# Altium footprint library Generic Footprint.PcbLib: 160 footprints (part 14 of 20) (continued)
## Symbol_FCC-Logo-1.5x1mm_silkscreen [mm] (continued)
1(0.03,0.585) 1(0.03,0.586) 1(0.03,0.588) 1(0.03,0.59) 1(0.03,0.592) 1(0.03,0.593) 1(0.03,0.595) 1(0.03,0.597) 1(0.03,0.598) 1(0.03,0.6) 1(0.03,0.602) 1(0.03,0.603) 1(0.03,0.605) 1(0.03,0.607) 1(0.03,0.609) 1(0.03,0.61) 1(0.03,0.612) 1(0.03,0.614) 1(0.03,0.615) 1(0.03,0.617) 1(0.03,0.619) 1(0.03,0.62) 1(0.03,0.622) 1(0.03,0.624) 1(0.03,0.626) 1(0.03,0.627) 1(0.03,0.629) 1(0.03,0.631) 1(0.03,0.632) 1(0.03,0.634) 1(0.03,0.636) 1(0.03,0.637) 1(0.03,0.639) 1(0.03,0.641) 1(0.03,0.643) 1(0.03,0.644) 1(0.03,0.646) 1(0.03,0.648) 1(0.03,0.649) 1(0.03,0.651) 1(0.03,0.653) 1(0.03,0.654) 1(0.03,0.656) 1(0.03,0.658) 1(0.03,0.659) 1(0.03,0.661) 1(0.03,0.663) 1(0.03,0.665) 1(0.03,0.666) 1(0.03,0.668) 1(0.03,0.67) 1(0.03,0.671) 1(0.03,0.673) 1(0.03,0.675) 1(0.03,0.677) 1(0.03,0.678) 1(0.03,0.68) 1(0.03,0.682) 1(0.03,0.683) 1(0.03,0.685) 1(0.03,0.687) 1(0.03,0.688) 1(0.03,0.69) 1(0.03,0.692) 1(0.03,0.694) 1(0.03,0.695) 1(0.03,0.697) 1(0.03,0.699) 1(0.03,0.7) 1(0.03,0.702) 1(0.03,0.704) 1(0.03,0.705) 1(0.03,0.707) 1(0.03,0.709) 1(0.03,0.711) 1(0.03,0.712) 1(0.03,0.714) 1(0.03,0.716) 1(0.03,0.717) 1(0.03,0.719) 1(0.03,0.721) 1(0.03,0.722) 1(0.03,0.724) 1(0.03,0.726) 1(0.03,0.728) 1(0.03,0.729) 1(0.03,0.731) 1(0.03,0.733) 1(0.03,0.734) 1(0.03,0.736) 1(0.03,0.738) 1(0.03,0.739) 1(0.03,0.741) 1(0.03,0.743) 1(0.03,0.744) 1(0.03,0.746) 1(0.03,0.748) 1(0.03,0.75) 1(0.03,0.751) 1(0.03,0.753) 1(0.03,0.755) 1(0.03,0.756) 1(0.03,0.758) 1(0.03,0.76) 1(0.03,0.762) 1(0.03,0.763) 1(0.03,0.765) 1(0.03,0.767) 1(0.03,0.768) 1(0.03,0.77) 1(0.03,0.772) 1(0.03,0.773) 1(0.03,0.775) 1(0.03,0.777) 1(0.03,0.779) 1(0.03,0.78) 1(0.03,0.782) 1(0.03,0.784) 1(0.03,0.785) 1(0.03,0.787) 1(0.03,0.789) 1(0.03,0.79) 1(0.03,0.792) 1(0.03,0.794) 1(0.03,0.796) 1(0.03,0.797) 1(0.03,0.799) 1(0.03,0.801) 1(0.03,0.802) 1(0.03,0.804) 1(0.03,0.806) 1(0.03,0.807) 1(0.03,0.809) 1(0.03,0.811) 1(0.03,0.813) 1(0.03,0.814) 1(0.03,0.816) 1(0.03,0.818) 1(0.03,0.819) 1(0.03,0.821) 1(0.03,0.823) 1(0.03,0.824) 1(0.03,0.826) 1(0.03,0.828) 1(0.03,0.83) 1(0.03,0.831) 1(0.03,0.833) 1(0.03,0.835) 1(0.03,0.836) 1(0.03,0.838) 1(0.03,0.84) 1(0.03,0.841) 1(0.03,0.843) 1(0.03,0.845) 1(0.03,0.847) 1(0.03,0.848) 1(0.03,0.85) 1(0.03,0.852) 1(0.03,0.853) 1(0.03,0.855) 1(0.03,0.857) 1(0.03,0.858) 1(0.03,0.86) 1(0.03,0.862) 1(0.03,0.863) 1(0.03,0.865) 1(0.03,0.867) 1(0.03,0.869) 1(0.03,0.87) 1(0.03,0.872) 1(0.03,0.874) 1(0.03,0.875) 1(0.03,0.877) 1(0.03,0.879) 1(0.03,0.881) 1(0.03,0.882) 1(0.03,0.884) 1(0.03,0.886) 1(0.03,0.887) 1(0.03,0.889) 1(0.03,0.891) 1(0.03,0.892) 1(0.03,0.894) 1(0.03,0.896) 1(0.03,0.898) 1(0.03,0.899) 1(0.03,0.901) 1(0.03,0.903) 1(0.03,0.904) 1(0.03,0.906) 1(0.03,0.908) 1(0.03,0.909) 1(0.03,0.911) 1(0.03,0.913) 1(0.03,0.915) 1(0.03,0.916) 1(0.03,0.918) 1(0.03,0.92) 1(0.03,0.921) 1(0.03,0.923) 1(0.03,0.925) 1(0.03,0.926) 1(0.03,0.928) 1(0.03,0.932) 1(0.03,0.933) 1(0.03,0.935) 1(0.03,0.937) 1(0.03,0.938) 1(0.03,0.94) 1(0.03,0.942) 1(0.03,0.943) 1(0.032,0.036) 1(0.032,0.037) 1(0.032,0.039) 1(0.032,0.042) 1(0.032,0.933) 1(0.032,0.935) 1(0.032,0.937) 1(0.032,0.938) 1(0.032,0.94) 1(0.032,0.942) 1(0.032,0.943) 1(0.032,0.947) 1(0.032,0.948) 1(0.032,0.95) 1(0.034,0.037) 1(0.034,0.039) 1(0.034,0.041) 1(0.034,0.94) 1(0.034,0.942) 1(0.034,0.943) 1(0.034,0.945) 1(0.034,0.947) 1(0.034,0.948) 1(0.034,0.95) 1(0.034,0.954) 1(0.034,0.959) 1(0.036,0.034) 1(0.036,0.036) 1(0.036,0.947) 1(0.036,0.948) 1(0.036,0.95) 1(0.036,0.952) 1(0.036,0.954) 1(0.036,0.957) 1(0.037,0.032) 1(0.037,0.034) 1(0.037,0.036) 1(0.037,0.959) 1(0.037,0.962) 1(0.037,0.964) 1(0.037,0.966) 1(0.039,0.954) 1(0.039,0.955) 1(0.039,0.967) 1(0.041,0.031) 1(0.041,0.959) 1(0.041,0.96) 1(0.041,0.969) 1(0.041,0.971) 1(0.041,0.972) 1(0.041,0.974) 1(0.042,0.032) 1(0.042,0.034) 1(0.042,0.971) 1(0.042,0.972) 1(0.042,0.974) 1(0.042,0.977) 1(0.044,0.029) 1(0.044,0.971) 1(0.044,0.972) 1(0.044,0.974) 1(0.044,0.977) 1(0.046,0.031) 1(0.046,0.032) 1(0.047,0.976) 1(0.047,0.977) 1(0.047,0.984) 1(0.049,0.027) 1(0.049,0.979) 1(0.049,0.981) 1(0.049,0.983) 1(0.049,0.984) 1(0.049,0.988) 1(0.049,0.989) 1(0.049,0.991) 1(0.049,0.993) 1(0.051,0.025) 1(0.051,0.029) 1(0.051,0.031) 1(0.051,0.984) 1(0.051,0.986) 1(0.051,0.988) 1(0.051,0.989) 1(0.051,0.994) 1(0.053,0.988) 1(0.053,0.989) 1(0.053,0.993) 1(0.053,0.994) 1(0.053,0.996) 1(0.054,0.993) 1(0.054,0.994) 1(0.054,0.998) 1(0.056,1) 1(0.056,1.001) 1(0.058,1.001) 1(0.058,1.003) 1(0.059,1.001) 1(0.059,1.003) 1(0.059,1.006) 1(0.059,1.008) 1(0.061,1.003) 1(0.061,1.006) 1(0.061,1.008) 1(0.061,1.011) 1(0.063,1.005) 1(0.063,1.01) 1(0.063,1.013) 1(0.065,1.006) 1(0.065,1.008) 1(0.065,1.01) 1(0.065,1.011) 1(0.066,1.01) 1(0.066,1.011) 1(0.066,1.015) 1(0.066,1.017) 1(0.066,1.018) 1(0.068,1.02) 1(0.07,1.022) 1(0.073,1.025) 1(0.073,1.027) 1(0.075,1.025) 1(0.075,1.027) 1(0.075,1.028) 1(0.076,1.023) 1(0.076,1.025) 1(0.076,1.028) 1(0.076,1.03) 1(0.078,1.027) 1(0.078,1.03) 1(0.078,1.032) 1(0.08,1.028) 1(0.08,1.03) 1(0.08,1.034) 1(0.081,1.032) 1(0.081,1.035) 1(0.083,1.032) 1(0.083,1.037) 1(0.085,1.039) 1(0.087,1.037) 1(0.087,1.04) 1(0.088,1.037) 1(0.088,1.039) 1(0.088,1.042) 1(0.09,1.039) 1(0.09,1.04) 1(0.09,1.044) 1(0.092,1.04) 1(0.092,1.042) 1(0.092,1.044) 1(0.092,1.045) 1(0.093,1.042) 1(0.093,1.045) 1(0.093,1.047) 1(0.095,1.044) 1(0.095,1.049) 1(0.097,1.045) 1(0.099,1.051) 1(0.1,1.052) 1(0.102,1.054) 1(0.104,1.052) 1(0.105,1.056) 1(0.107,1.052) 1(0.107,1.057) 1(0.109,1.059) 1(0.11,1.057) 1(0.11,1.059) 1(0.11,1.061) 1(0.114,1.057) 1(0.114,1.061) 1(0.114,1.062) 1(0.115,1.059) 1(0.119,1.061) 1(0.119,1.064) 1(0.121,1.066) 1(0.122,1.067) 1(0.127,1.066) 1(0.127,1.067) 1(0.127,1.069) 1(0.131,1.066) 1(0.131,1.067) 1(0.132,1.069) 1(0.132,1.071) 1(0.136,1.069) 1(0.136,1.071) 1(0.136,1.073) 1(0.143,1.071) 1(0.143,1.073) 1(0.143,1.074) 1(0.148,1.076) 1(0.15,1.073) 1(0.15,1.078) 1(0.151,1.074) 1(0.16,1.074) 1(0.161,1.079) 1(0.195,0.027) 1(0.195,0.034) 1(0.195,0.036) 1(0.195,0.037) 1(0.195,0.039) 1(0.195,0.041) 1(0.195,0.042) 1(0.195,0.044) 1(0.195,0.046) 1(0.195,0.047) 1(0.195,0.049) 1(0.195,0.051) 1(0.195,0.053) 1(0.195,0.054) 1(0.195,0.056) 1(0.195,0.058) 1(0.195,0.059) 1(0.195,0.061) 1(0.195,0.063) 1(0.195,0.065) 1(0.195,0.066) 1(0.195,0.068) 1(0.195,0.07) 1(0.195,0.071) 1(0.195,0.073) 1(0.195,0.075) 1(0.195,0.076) 1(0.195,0.078) 1(0.195,0.08) 1(0.195,0.082) 1(0.195,0.083) 1(0.195,0.085) 1(0.195,0.087) 1(0.195,0.088) 1(0.195,0.09) 1(0.195,0.092) 1(0.195,0.093) 1(0.195,0.095) 1(0.195,0.097) 1(0.195,0.099) 1(0.195,0.1) 1(0.195,0.102) 1(0.195,0.104) 1(0.195,0.105) 1(0.195,0.107) 1(0.195,0.109) 1(0.195,0.11) 1(0.195,0.112) 1(0.195,0.114) 1(0.195,0.116) 1(0.195,0.117) 1(0.195,0.119) 1(0.195,0.121) 1(0.195,0.122) 1(0.195,0.124) 1(0.195,0.126) 1(0.195,0.127) 1(0.195,0.129) 1(0.195,0.131) 1(0.195,0.132) 1(0.195,0.134) 1(0.195,0.136) 1(0.195,0.138) 1(0.195,0.139) 1(0.195,0.141) 1(0.195,0.143) 1(0.195,0.144) 1(0.195,0.146) 1(0.195,0.148) 1(0.195,0.15) 1(0.195,0.151) 1(0.195,0.153) 1(0.195,0.155) 1(0.195,0.156) 1(0.195,0.158) 1(0.195,0.16) 1(0.195,0.161) 1(0.195,0.163) 1(0.195,0.165) 1(0.195,0.166) 1(0.195,0.168) 1(0.195,0.17) 1(0.195,0.172) 1(0.195,0.173) 1(0.195,0.175) 1(0.195,0.177) 1(0.195,0.178) 1(0.195,0.18) 1(0.195,0.182) 1(0.195,0.184) 1(0.195,0.185) 1(0.195,0.187) 1(0.195,0.189) 1(0.195,0.19) 1(0.195,0.192) 1(0.195,0.194) 1(0.195,0.195) 1(0.195,0.197) 1(0.195,0.199) 1(0.195,0.201) 1(0.195,0.202) 1(0.195,0.204) 1(0.195,0.206) 1(0.195,0.207) 1(0.195,0.209) 1(0.195,0.211) 1(0.195,0.212) 1(0.195,0.214) 1(0.195,0.216) 1(0.195,0.218) 1(0.195,0.219) 1(0.195,0.221) 1(0.195,0.223) 1(0.195,0.224) 1(0.195,0.226) 1(0.195,0.228) 1(0.195,0.229) 1(0.195,0.231) 1(0.195,0.233) 1(0.195,0.235) 1(0.195,0.236) 1(0.195,0.238) 1(0.195,0.24) 1(0.195,0.241) 1(0.195,0.243) 1(0.195,0.245) 1(0.195,0.246) 1(0.195,0.248) 1(0.195,0.25) 1(0.195,0.251) 1(0.195,0.253) 1(0.195,0.255) 1(0.195,0.257) 1(0.195,0.258) 1(0.195,0.26) 1(0.195,0.262) 1(0.195,0.263) 1(0.195,0.265) 1(0.195,0.267) 1(0.195,0.269) 1(0.195,0.27) 1(0.195,0.272) 1(0.195,0.274) 1(0.195,0.275) 1(0.195,0.277) 1(0.195,0.279) 1(0.195,0.28) 1(0.195,0.282) 1(0.195,0.284) 1(0.195,0.286) 1(0.195,0.287) 1(0.195,0.289) 1(0.195,0.291) 1(0.195,0.292) 1(0.195,0.294) 1(0.195,0.296) 1(0.195,0.297) 1(0.195,0.299) 1(0.195,0.301) 1(0.195,0.303) 1(0.195,0.304) 1(0.195,0.306) 1(0.195,0.308) 1(0.195,0.309) 1(0.195,0.311) 1(0.195,0.313) 1(0.195,0.314) 1(0.195,0.316) 1(0.195,0.318) 1(0.195,0.32) 1(0.195,0.321) 1(0.195,0.323) 1(0.195,0.325) 1(0.195,0.326) 1(0.195,0.328) 1(0.195,0.33) 1(0.195,0.331) 1(0.195,0.333) 1(0.195,0.335) 1(0.195,0.336) 1(0.195,0.338) 1(0.195,0.34) 1(0.195,0.342) 1(0.195,0.343) 1(0.195,0.345) 1(0.195,0.347) 1(0.195,0.348) 1(0.195,0.35) 1(0.195,0.352) 1(0.195,0.354) 1(0.195,0.355) 1(0.195,0.357) 1(0.195,0.359) 1(0.195,0.36) 1(0.195,0.362) 1(0.195,0.364) 1(0.195,0.365) 1(0.195,0.367) 1(0.195,0.369) 1(0.195,0.371) 1(0.195,0.372) 1(0.195,0.374) 1(0.195,0.376) 1(0.195,0.377) 1(0.195,0.379) 1(0.195,0.381) 1(0.195,0.382) 1(0.195,0.384) 1(0.195,0.386) 1(0.195,0.388) 1(0.195,0.389) 1(0.195,0.391) 1(0.195,0.393) 1(0.195,0.394) 1(0.195,0.396) 1(0.195,0.398) 1(0.195,0.399) 1(0.195,0.401) 1(0.195,0.403) 1(0.195,0.405) 1(0.195,0.406) 1(0.195,0.408) 1(0.195,0.41) 1(0.195,0.411) 1(0.195,0.413) 1(0.195,0.415) 1(0.195,0.416) 1(0.195,0.418) 1(0.195,0.42) 1(0.195,0.422) 1(0.195,0.423) 1(0.195,0.425) 1(0.195,0.427) 1(0.195,0.428) 1(0.195,0.43) 1(0.195,0.432) 1(0.195,0.433) 1(0.195,0.435) 1(0.195,0.437) 1(0.195,0.439) 1(0.195,0.44) 1(0.195,0.442) 1(0.195,0.444) 1(0.195,0.445) 1(0.195,0.447) 1(0.195,0.449) 1(0.195,0.45) 1(0.195,0.452) 1(0.195,0.454) 1(0.195,0.455) 1(0.195,0.457) 1(0.195,0.459) 1(0.195,0.461) 1(0.195,0.464) 1(0.195,0.874) 1(0.195,0.875) 1(0.197,0.025) 1(0.197,0.034) 1(0.197,0.036) 1(0.197,0.037) 1(0.197,0.039) 1(0.197,0.041) 1(0.197,0.042) 1(0.197,0.044) 1(0.197,0.046) 1(0.197,0.047) 1(0.197,0.049) 1(0.197,0.051) 1(0.197,0.053) 1(0.197,0.054) 1(0.197,0.056) 1(0.197,0.058) 1(0.197,0.059) 1(0.197,0.061) 1(0.197,0.063) 1(0.197,0.065) 1(0.197,0.066) 1(0.197,0.068) 1(0.197,0.07) 1(0.197,0.071) 1(0.197,0.073) 1(0.197,0.075) 1(0.197,0.076) 1(0.197,0.078) 1(0.197,0.08) 1(0.197,0.082) 1(0.197,0.083) 1(0.197,0.085) 1(0.197,0.087) 1(0.197,0.088) 1(0.197,0.09) 1(0.197,0.092) 1(0.197,0.093) 1(0.197,0.095) 1(0.197,0.097) 1(0.197,0.099) 1(0.197,0.1) 1(0.197,0.102) 1(0.197,0.104) 1(0.197,0.105) 1(0.197,0.107) 1(0.197,0.109) 1(0.197,0.11) 1(0.197,0.112) 1(0.197,0.114) 1(0.197,0.116) 1(0.197,0.117) 1(0.197,0.119) 1(0.197,0.121) 1(0.197,0.122) 1(0.197,0.124) 1(0.197,0.126) 1(0.197,0.127) 1(0.197,0.129) 1(0.197,0.131) 1(0.197,0.132) 1(0.197,0.134) 1(0.197,0.136) 1(0.197,0.138) 1(0.197,0.139) 1(0.197,0.141) 1(0.197,0.143) 1(0.197,0.144) 1(0.197,0.146) 1(0.197,0.148) 1(0.197,0.15) 1(0.197,0.151) 1(0.197,0.153) 1(0.197,0.155) 1(0.197,0.156) 1(0.197,0.158) 1(0.197,0.16) 1(0.197,0.161) 1(0.197,0.163) 1(0.197,0.165) 1(0.197,0.166) 1(0.197,0.168) 1(0.197,0.17) 1(0.197,0.172) 1(0.197,0.173) 1(0.197,0.175) 1(0.197,0.177) 1(0.197,0.178) 1(0.197,0.18) 1(0.197,0.182) 1(0.197,0.184) 1(0.197,0.185) 1(0.197,0.187) 1(0.197,0.189) 1(0.197,0.19) 1(0.197,0.192) 1(0.197,0.194) 1(0.197,0.195) 1(0.197,0.197) 1(0.197,0.199) 1(0.197,0.201) 1(0.197,0.202) 1(0.197,0.204) 1(0.197,0.206) 1(0.197,0.207) 1(0.197,0.209) 1(0.197,0.211) 1(0.197,0.212) 1(0.197,0.214) 1(0.197,0.216) 1(0.197,0.218) 1(0.197,0.219) 1(0.197,0.221) 1(0.197,0.223) 1(0.197,0.224) 1(0.197,0.226) 1(0.197,0.228) 1(0.197,0.229) 1(0.197,0.231) 1(0.197,0.233) 1(0.197,0.235) 1(0.197,0.236) 1(0.197,0.238) 1(0.197,0.24) 1(0.197,0.241) 1(0.197,0.243) 1(0.197,0.245) 1(0.197,0.246) 1(0.197,0.248) 1(0.197,0.25) 1(0.197,0.251) 1(0.197,0.253) 1(0.197,0.255) 1(0.197,0.257) 1(0.197,0.258) 1(0.197,0.26) 1(0.197,0.262) 1(0.197,0.263) 1(0.197,0.265) 1(0.197,0.267) 1(0.197,0.269) 1(0.197,0.27) 1(0.197,0.272) 1(0.197,0.274) 1(0.197,0.275) 1(0.197,0.277) 1(0.197,0.279) 1(0.197,0.28) 1(0.197,0.282) 1(0.197,0.284) 1(0.197,0.286) 1(0.197,0.287) 1(0.197,0.289) 1(0.197,0.291) 1(0.197,0.292) 1(0.197,0.294) 1(0.197,0.296) 1(0.197,0.297) 1(0.197,0.299) 1(0.197,0.301) 1(0.197,0.303) 1(0.197,0.304) 1(0.197,0.306) 1(0.197,0.308) 1(0.197,0.309) 1(0.197,0.311) 1(0.197,0.313) 1(0.197,0.314) 1(0.197,0.316) 1(0.197,0.318) 1(0.197,0.32) 1(0.197,0.321) 1(0.197,0.323) 1(0.197,0.325) 1(0.197,0.326) 1(0.197,0.328) 1(0.197,0.33) 1(0.197,0.331) 1(0.197,0.333) 1(0.197,0.335) 1(0.197,0.336) 1(0.197,0.338) 1(0.197,0.34) 1(0.197,0.342) 1(0.197,0.343) 1(0.197,0.345) 1(0.197,0.347) 1(0.197,0.348) 1(0.197,0.35) 1(0.197,0.352) 1(0.197,0.354) 1(0.197,0.355) 1(0.197,0.357) 1(0.197,0.359) 1(0.197,0.36) 1(0.197,0.362) 1(0.197,0.364) 1(0.197,0.365) 1(0.197,0.367) 1(0.197,0.369) 1(0.197,0.371) 1(0.197,0.372) 1(0.197,0.374) 1(0.197,0.376) 1(0.197,0.377) 1(0.197,0.379) 1(0.197,0.381) 1(0.197,0.382) 1(0.197,0.384) 1(0.197,0.386) 1(0.197,0.388) 1(0.197,0.389) 1(0.197,0.391) 1(0.197,0.393) 1(0.197,0.394) 1(0.197,0.396) 1(0.197,0.398) 1(0.197,0.399) 1(0.197,0.401) 1(0.197,0.403) 1(0.197,0.405) 1(0.197,0.406) 1(0.197,0.408) 1(0.197,0.41) 1(0.197,0.411) 1(0.197,0.413) 1(0.197,0.415) 1(0.197,0.416) 1(0.197,0.418) 1(0.197,0.42) 1(0.197,0.422) 1(0.197,0.423) 1(0.197,0.425) 1(0.197,0.427) 1(0.197,0.428) 1(0.197,0.43) 1(0.197,0.432) 1(0.197,0.433) 1(0.197,0.435) 1(0.197,0.437) 1(0.197,0.439) 1(0.197,0.44) 1(0.197,0.442) 1(0.197,0.444) 1(0.197,0.445) 1(0.197,0.447) 1(0.197,0.449) 1(0.197,0.45) 1(0.197,0.452) 1(0.197,0.454) 1(0.197,0.455) 1(0.197,0.457) 1(0.197,0.459) 1(0.197,0.461) 1(0.197,0.464) 1(0.197,0.469) 1(0.197,0.874) 1(0.197,0.875) 1(0.197,0.877) 1(0.197,0.879) 1(0.199,0.029) 1(0.199,0.031) 1(0.199,0.467) 1(0.199,0.607) 1(0.199,0.609) 1(0.199,0.61) 1(0.199,0.612) 1(0.199,0.614) 1(0.199,0.615) 1(0.199,0.617) 1(0.199,0.619) 1(0.199,0.62) 1(0.199,0.622) 1(0.199,0.624) 1(0.199,0.626) 1(0.199,0.627) 1(0.199,0.629) 1(0.199,0.631) 1(0.199,0.632) 1(0.199,0.634) 1(0.199,0.636) 1(0.199,0.637) 1(0.199,0.639) 1(0.199,0.641) 1(0.199,0.643) 1(0.199,0.644) 1(0.199,0.646) 1(0.199,0.648) 1(0.199,0.649) 1(0.199,0.651) 1(0.199,0.653) 1(0.199,0.654) 1(0.199,0.656) 1(0.199,0.658) 1(0.199,0.659) 1(0.199,0.661) 1(0.199,0.663) 1(0.199,0.665) 1(0.199,0.666) 1(0.199,0.668) 1(0.199,0.67) 1(0.199,0.671) 1(0.199,0.673) 1(0.199,0.675) 1(0.199,0.677) 1(0.199,0.678) 1(0.199,0.68) 1(0.199,0.682) 1(0.199,0.683) 1(0.199,0.685) 1(0.199,0.687) 1(0.199,0.688) 1(0.199,0.69) 1(0.199,0.692) 1(0.199,0.694) 1(0.199,0.695) 1(0.199,0.697) 1(0.199,0.699) 1(0.199,0.7) 1(0.199,0.702) 1(0.199,0.704) 1(0.199,0.705) 1(0.199,0.707) 1(0.199,0.709) 1(0.199,0.711) 1(0.199,0.712) 1(0.199,0.714) 1(0.199,0.716) 1(0.199,0.717) 1(0.199,0.719) 1(0.199,0.721) 1(0.199,0.722) 1(0.199,0.724) 1(0.199,0.726) 1(0.199,0.728) 1(0.199,0.729) 1(0.199,0.731) 1(0.199,0.733) 1(0.199,0.734) 1(0.199,0.736) 1(0.199,0.738) 1(0.199,0.739) 1(0.199,0.741) 1(0.199,0.743) 1(0.199,0.744) 1(0.199,0.746) 1(0.199,0.748) 1(0.199,0.75) 1(0.199,0.751) 1(0.199,0.753) 1(0.199,0.755) 1(0.199,0.756) 1(0.199,0.758) 1(0.199,0.76) 1(0.199,0.762) 1(0.199,0.763) 1(0.199,0.765) 1(0.199,0.767) 1(0.199,0.768) 1(0.199,0.77) 1(0.199,0.772) 1(0.199,0.773) 1(0.199,0.775) 1(0.199,0.777) 1(0.199,0.779) 1(0.199,0.78) 1(0.199,0.782) 1(0.199,0.784) 1(0.199,0.785) 1(0.199,0.787) 1(0.199,0.789) 1(0.199,0.79) 1(0.199,0.792) 1(0.199,0.794) 1(0.199,0.796) 1(0.199,0.797) 1(0.199,0.799) 1(0.199,0.801) 1(0.199,0.802) 1(0.199,0.804) 1(0.199,0.806) 1(0.199,0.807) 1(0.199,0.809) 1(0.199,0.811) 1(0.199,0.813) 1(0.199,0.814) 1(0.199,0.816) 1(0.199,0.818) 1(0.199,0.819) 1(0.199,0.821) 1(0.199,0.823) 1(0.199,0.824) 1(0.199,0.826) 1(0.199,0.828) 1(0.199,0.83) 1(0.199,0.831) 1(0.199,0.833) 1(0.199,0.835) 1(0.199,0.836) 1(0.199,0.838) 1(0.199,0.84) 1(0.199,0.841) 1(0.199,0.843) 1(0.199,0.845) 1(0.199,0.847) 1(0.199,0.848) 1(0.199,0.85) 1(0.199,0.852) 1(0.199,0.853) 1(0.199,0.855) 1(0.199,0.857) 1(0.199,0.858) 1(0.199,0.86) 1(0.199,0.862) 1(0.199,0.863) 1(0.199,0.865) 1(0.199,0.867) 1(0.199,0.869) 1(0.199,0.87) 1(0.199,0.872) 1(0.199,0.875) 1(0.2,0.029) 1(0.2,0.032) 1(0.2,0.034) 1(0.2,0.036) 1(0.2,0.037) 1(0.2,0.039) 1(0.2,0.041) 1(0.2,0.042) 1(0.2,0.044) 1(0.2,0.046) 1(0.2,0.047) 1(0.2,0.049) 1(0.2,0.051) 1(0.2,0.053) 1(0.2,0.054) 1(0.2,0.056) 1(0.2,0.058) 1(0.2,0.059) 1(0.2,0.061) 1(0.2,0.063) 1(0.2,0.065) 1(0.2,0.066) 1(0.2,0.068) 1(0.2,0.07) 1(0.2,0.071) 1(0.2,0.073) 1(0.2,0.075) 1(0.2,0.076) 1(0.2,0.078) 1(0.2,0.08) 1(0.2,0.082) 1(0.2,0.083) 1(0.2,0.085) 1(0.2,0.087) 1(0.2,0.088) 1(0.2,0.09) 1(0.2,0.092) 1(0.2,0.093) 1(0.2,0.095) 1(0.2,0.097) 1(0.2,0.099) 1(0.2,0.1) 1(0.2,0.102) 1(0.2,0.104) 1(0.2,0.105) 1(0.2,0.107) 1(0.2,0.109) 1(0.2,0.11) 1(0.2,0.112) 1(0.2,0.114) 1(0.2,0.116) 1(0.2,0.117) 1(0.2,0.119) 1(0.2,0.121) 1(0.2,0.122) 1(0.2,0.124) 1(0.2,0.126) 1(0.2,0.127) 1(0.2,0.129) 1(0.2,0.131) 1(0.2,0.132) 1(0.2,0.134) 1(0.2,0.136) 1(0.2,0.138) 1(0.2,0.139) 1(0.2,0.141) 1(0.2,0.143) 1(0.2,0.144) 1(0.2,0.146) 1(0.2,0.148) 1(0.2,0.15) 1(0.2,0.151) 1(0.2,0.153) 1(0.2,0.155) 1(0.2,0.156) 1(0.2,0.158) 1(0.2,0.16) 1(0.2,0.161) 1(0.2,0.163) 1(0.2,0.165) 1(0.2,0.166) 1(0.2,0.168) 1(0.2,0.17) 1(0.2,0.172) 1(0.2,0.173) 1(0.2,0.175) 1(0.2,0.177) 1(0.2,0.178) 1(0.2,0.18) 1(0.2,0.182) 1(0.2,0.184) 1(0.2,0.185) 1(0.2,0.187) 1(0.2,0.189) 1(0.2,0.19) 1(0.2,0.192) 1(0.2,0.194) 1(0.2,0.195) 1(0.2,0.197) 1(0.2,0.199) 1(0.2,0.201) 1(0.2,0.202) 1(0.2,0.204) 1(0.2,0.206) 1(0.2,0.207) 1(0.2,0.209) 1(0.2,0.211) 1(0.2,0.212) 1(0.2,0.214) 1(0.2,0.216) 1(0.2,0.218) 1(0.2,0.219) 1(0.2,0.221) 1(0.2,0.223) 1(0.2,0.224) 1(0.2,0.226) 1(0.2,0.228) 1(0.2,0.229) 1(0.2,0.231) 1(0.2,0.233) 1(0.2,0.235) 1(0.2,0.236) 1(0.2,0.238) 1(0.2,0.24) 1(0.2,0.241) 1(0.2,0.243) 1(0.2,0.245) 1(0.2,0.246) 1(0.2,0.248) 1(0.2,0.25) 1(0.2,0.251) 1(0.2,0.253) 1(0.2,0.255) 1(0.2,0.257) 1(0.2,0.258) 1(0.2,0.26) 1(0.2,0.262) 1(0.2,0.263) 1(0.2,0.265) 1(0.2,0.267) 1(0.2,0.269) 1(0.2,0.27) 1(0.2,0.272) 1(0.2,0.274) 1(0.2,0.275) 1(0.2,0.277) 1(0.2,0.279) 1(0.2,0.28) 1(0.2,0.282) 1(0.2,0.284) 1(0.2,0.286) 1(0.2,0.287) 1(0.2,0.289) 1(0.2,0.291) 1(0.2,0.292) 1(0.2,0.294) 1(0.2,0.296) 1(0.2,0.297) 1(0.2,0.299) 1(0.2,0.301) 1(0.2,0.303) 1(0.2,0.304) 1(0.2,0.306) 1(0.2,0.308) 1(0.2,0.309) 1(0.2,0.311) 1(0.2,0.313) 1(0.2,0.314) 1(0.2,0.316) 1(0.2,0.318) 1(0.2,0.32) 1(0.2,0.321) 1(0.2,0.323) 1(0.2,0.325) 1(0.2,0.326) 1(0.2,0.328) 1(0.2,0.33) 1(0.2,0.331) 1(0.2,0.333) 1(0.2,0.335) 1(0.2,0.336) 1(0.2,0.338) 1(0.2,0.34) 1(0.2,0.342) 1(0.2,0.343) 1(0.2,0.345) 1(0.2,0.347) 1(0.2,0.348) 1(0.2,0.35) 1(0.2,0.352) 1(0.2,0.354) 1(0.2,0.355) 1(0.2,0.357) 1(0.2,0.359) 1(0.2,0.36) 1(0.2,0.362) 1(0.2,0.364) 1(0.2,0.365) 1(0.2,0.367) 1(0.2,0.369) 1(0.2,0.371) 1(0.2,0.372) 1(0.2,0.374) 1(0.2,0.376) 1(0.2,0.377) 1(0.2,0.379) 1(0.2,0.381) 1(0.2,0.382) 1(0.2,0.384) 1(0.2,0.386) 1(0.2,0.388) 1(0.2,0.389) 1(0.2,0.391) 1(0.2,0.393) 1(0.2,0.394) 1(0.2,0.396) 1(0.2,0.398) 1(0.2,0.399) 1(0.2,0.401) 1(0.2,0.403) 1(0.2,0.405) 1(0.2,0.406) 1(0.2,0.408) 1(0.2,0.41) 1(0.2,0.411) 1(0.2,0.413) 1(0.2,0.415) 1(0.2,0.416) 1(0.2,0.418) 1(0.2,0.42) 1(0.2,0.422) 1(0.2,0.423) 1(0.2,0.425) 1(0.2,0.427) 1(0.2,0.428) 1(0.2,0.43) 1(0.2,0.432) 1(0.2,0.433) 1(0.2,0.435) 1(0.2,0.437) 1(0.2,0.439) 1(0.2,0.44) 1(0.2,0.442) 1(0.2,0.444) 1(0.2,0.445) 1(0.2,0.447) 1(0.2,0.449) 1(0.2,0.45) 1(0.2,0.452) 1(0.2,0.454) 1(0.2,0.455) 1(0.2,0.457) 1(0.2,0.459) 1(0.2,0.461) 1(0.2,0.462) 1(0.2,0.464) 1(0.2,0.466) 1(0.2,0.469) 1(0.2,0.603) 1(0.2,0.874) 1(0.2,0.875) 1(0.2,0.877) 1(0.2,0.879) 1(0.2,0.881) 1(0.2,0.882) 1(0.202,0.469) 1(0.202,0.471) 1(0.202,0.473) 1(0.202,0.603) 1(0.202,0.875) 1(0.202,0.877) 1(0.202,0.879) 1(0.202,0.884) 1(0.204,0.476) 1(0.204,0.602) 1(0.204,0.605) 1(0.204,0.882) 1(0.204,0.884) 1(0.204,0.887) 1(0.206,0.882) 1(0.206,0.884) 1(0.206,0.886) 1(0.206,0.887) 1(0.207,0.891) 1(0.209,0.887) 1(0.209,0.891) 1(0.209,0.892) 1(0.211,0.473) 1(0.211,0.474) 1(0.211,0.476) 1(0.211,0.889) 1(0.211,0.892) 1(0.212,0.894) 1(0.214,0.891) 1(0.214,0.894) 1(0.216,0.892) 1(0.218,0.894) 1(0.219,0.896) 1(0.219,0.899) 1(0.223,0.898) 1(0.223,0.899) 1(0.223,0.901) 1(0.226,0.899) 1(0.226,0.901) 1(0.226,0.903) 1(0.53,0.602) 1(0.53,0.605) 1(0.532,0.474) 1(0.534,0.459) 1(0.534,0.461) 1(0.534,0.462) 1(0.534,0.464) 